# Altium footprint library IC_SMD_QUAD.PCBLIB: 101 footprints (part 7 of 7)
Each footprint in its own frame and in the unit in brackets; x right, y up, seen from the top. Pads: shape width x height; smd on the part's side, far side on the other; paste and mask are expansions set on the pad; w line width, h text height; cw(c..) or ccw(c..) is an arc to the next point about the centre after c.
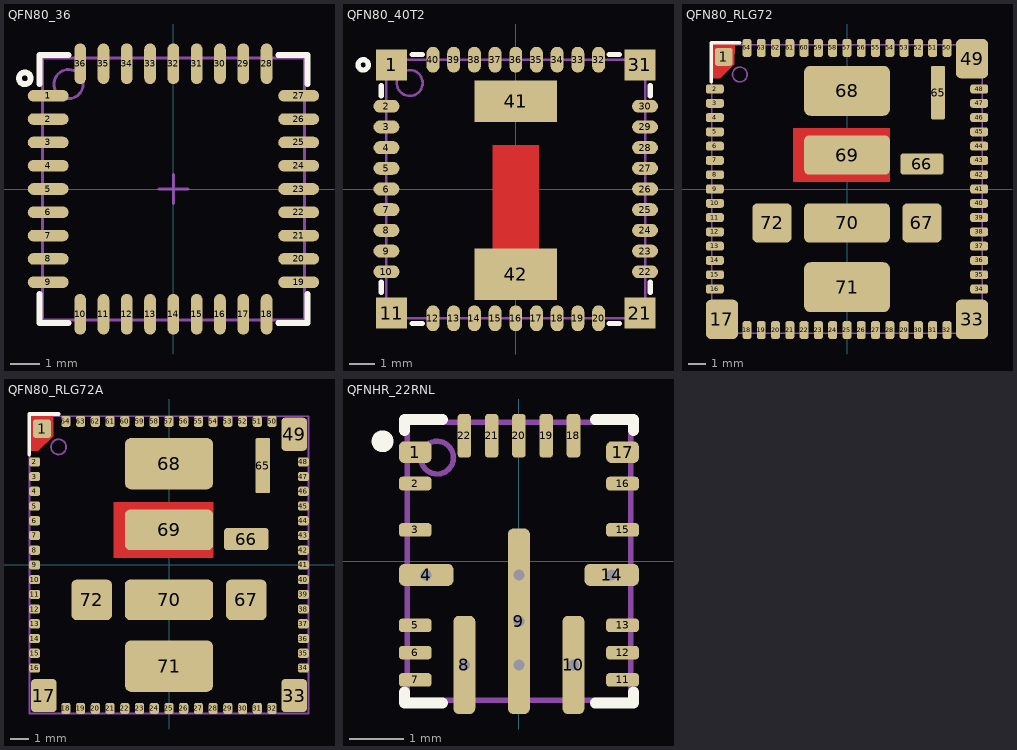
[diagram p6: the footprints below, top view; thin cyan lines are the x and y axes]

## QFN80_36 [mm] "LPCC (HMC6343)IDT72255, 9X9mm, 0.8mm"
height 2
pads (36):
  oval 1.4x0.4 smd mask+0.05: 1(-4.3,3.2) 2(-4.3,2.4) 3(-4.3,1.6) 4(-4.3,0.8) 5(-4.3,0) 6(-4.3,-0.8) 7(-4.3,-1.6) 8(-4.3,-2.4) 9(-4.3,-3.2) 19(4.3,-3.2) 20(4.3,-2.4) 21(4.3,-1.6) 22(4.3,-0.8) 23(4.3,0) 24(4.3,0.8) 25(4.3,1.6) 26(4.3,2.4) 27(4.3,3.2)
  oval 0.4x1.4 smd mask+0.05: 10(-3.2,-4.3) 11(-2.4,-4.3) 12(-1.6,-4.3) 13(-0.8,-4.3) 14(0,-4.3) 15(0.8,-4.3) 16(1.6,-4.3) 17(2.4,-4.3) 18(3.2,-4.3) 28(3.2,4.3) 29(2.4,4.3) 30(1.6,4.3) 31(0.8,4.3) 32(0,4.3) 33(-0.8,4.3) 34(-1.6,4.3) 35(-2.4,4.3) 36(-3.2,4.3)
TopOverlay:
  circle w0.2: c-5.1,3.8 r0.2
  lines w0.2: -4.6,-3.6 -4.6,-4.6 -3.6,-4.6 ; -4.6,3.6 -4.6,4.6 -3.6,4.6 ; 3.6,-4.6 4.6,-4.6 4.6,-3.6 ; 3.6,4.6 4.6,4.6 4.6,3.6
Mechanical13:
  circle w0.1: c-3.6,3.6 r0.5
  lines w0.1: -4.5,-4.5 4.5,-4.5 4.5,4.5 -4.5,4.5 -4.5,-4.5
Mechanical15:
  lines w0.1: -0.5,0 0.5,0 ; 0,-0.5 0,0.5
3D body "QFN80_36--.step": height 2, standoff 0, extent -4.5,-4.5 4.5,4.5

## QFN80_40T2 [mm] "QFN, 40-Leads, Body 10x10mm, Pitch 0.80mm RVQ (TI)"
height 4.4
pads (42):
  rect 1.2x1.2 smd mask+0.1: 1(-4.8,4.8) 11(-4.8,-4.8) 21(4.8,-4.8) 31(4.8,4.8)
  oval 1x0.5 smd mask+0.1: 2(-5,3.2) 3(-5,2.4) 4(-5,1.6) 5(-5,0.8) 6(-5,0) 7(-5,-0.8) 8(-5,-1.6) 9(-5,-2.4) 10(-5,-3.2) 22(5,-3.2) 23(5,-2.4) 24(5,-1.6) 25(5,-0.8) 26(5,0) 27(5,0.8) 28(5,1.6) 29(5,2.4) 30(5,3.2)
  oval 0.5x1 smd mask+0.1: 12(-3.2,-5) 13(-2.4,-5) 14(-1.6,-5) 15(-0.8,-5) 16(0,-5) 17(0.8,-5) 18(1.6,-5) 19(2.4,-5) 20(3.2,-5) 32(3.2,5) 33(2.4,5) 34(1.6,5) 35(0.8,5) 36(0,5) 37(-0.8,5) 38(-1.6,5) 39(-2.4,5) 40(-3.2,5)
  rect 3.2x1.6 smd mask+0.1: 41(0,3.4)
  rect 3.2x2 smd mask+0.1: 42(0,-3.3)
TopLayer:
  rectangle: -0.9,-2.4 0.9,1.7
TopOverlay:
  circle w0.2: c-5.9,4.8 r0.2
  lines w0.2: -5.2,-4 -5.2,-3.6 ; -5.2,3.6 -5.2,4 ; -4,-5.2 -3.6,-5.2 ; -4,5.2 -3.6,5.2 ; 3.6,-5.2 4,-5.2 ; 3.6,5.2 4,5.2 ; 5.2,-4 5.2,-3.6 ; 5.2,3.6 5.2,4
TopPaste:
  rectangle: -0.7,-1.9 0.7,1.6
TopSolder:
  rectangle: -1.7,-4.3 1.7,-2.9
  rectangle: -0.9,-2.9 0.9,1.8
Mechanical13:
  circle w0.1: c-4.1,4.1 r0.5
  lines w0.1: -5,-5 -5,5 5,5 5,-5 -5,-5
3D body: height 4.4, standoff 0.08, extent -5,-5 5,5

## QFN80_RLG72 [mm] "RLG-72, 0.8mm pitch, 15X16mm"
pads (72):
  rrect30% 1x1 smd paste-0.5 mask+0.051: 1(-6.9,7.4)
  rrect50% 1x0.5 smd paste+0 mask+0.075: 2(-7.4,5.6) 3(-7.4,4.8) 4(-7.4,4) 5(-7.4,3.2) 6(-7.4,2.4) 7(-7.4,1.6) 8(-7.4,0.8) 9(-7.4,0) 10(-7.4,-0.8) 11(-7.4,-1.6) 12(-7.4,-2.4) 13(-7.4,-3.2) 14(-7.4,-4) 15(-7.4,-4.8) 16(-7.4,-5.6) 34(7.4,-5.6) 35(7.4,-4.8) 36(7.4,-4) 37(7.4,-3.2) 38(7.4,-2.4) 39(7.4,-1.6) 40(7.4,-0.8) 41(7.4,0) 42(7.4,0.8) 43(7.4,1.6) 44(7.4,2.4) 45(7.4,3.2) 46(7.4,4) 47(7.4,4.8) 48(7.4,5.6)
  rrect30% 1.8x2.2 smd paste-0.2 mask+0.075: 17(-7,-7.3) 33(7,-7.3) 49(7,7.3)
  rrect50% 0.5x1 smd paste+0 mask+0.075: 18(-5.602,-7.9) 19(-4.802,-7.9) 20(-4.002,-7.9) 21(-3.202,-7.9) 22(-2.402,-7.9) 23(-1.602,-7.9) 24(-0.802,-7.9) 25(-0.002,-7.9) 26(0.798,-7.9) 27(1.598,-7.9) 28(2.398,-7.9) 29(3.198,-7.9) 30(3.998,-7.9) 31(4.798,-7.9) 32(5.598,-7.9) 50(5.598,7.9) 51(4.798,7.9) 52(3.998,7.9) 53(3.198,7.9) 54(2.398,7.9) 55(1.598,7.9) 56(0.798,7.9) 57(-0.002,7.9) 58(-0.802,7.9) 59(-1.602,7.9) 60(-2.402,7.9) 61(-3.202,7.9) 62(-4.002,7.9) 63(-4.802,7.9) 64(-5.602,7.9)
  rrect25% 0.8x3 smd paste-1 mask+0.075: 65(5.1,5.4)
  rrect25% 2.4x1.2 smd paste-2 mask+0.075: 66(4.2,1.4)
  rrect25% 2.2x2.2 smd paste-2 mask+0.075: 67(4.2,-1.9) 72(-4.2,-1.9)
  rrect25% 4.8x2.8 smd paste-3 mask+0.075: 68(0,5.5) 71(0,-5.5)
  rrect25% 4.8x2.2 smd paste-1.2 mask+0: 69(0,1.9)
  rrect25% 4.8x2.2 smd paste-2 mask+0.051: 70(0,-1.9)
TopLayer:
  region: -6.3,8.1 -7.5,8.1 -7.5,6.2 -7.1,6.2 -6.3,7
  region: -3,3.4 -3,0.4 2.398,0.4 2.398,3.4
TopOverlay:
  lines w0.2: -7.6,6 -7.6,8.2 -6,8.2
TopPaste:
  region: -7.5,6.6 -6.7,6.6 -7.08,6.22 -7.5,6.22
  region: -4.3,-2 -5.3,-2 -5.3,-3 -4.3,-3
  region: -4.1,-2 -3.1,-2 -3.1,-3 -4.1,-3
  region: -4.1,-1.8 -3.1,-1.8 -3.1,-0.8 -4.1,-0.8
  region: -4.3,-1.8 -5.3,-1.8 -5.3,-0.8 -4.3,-0.8
  region: -0.1,-5.6 -2.3,-5.6 -2.3,-6.8 -0.1,-6.8
  region: 0.1,-5.6 2.3,-5.6 2.3,-6.8 0.1,-6.8
  region: 0.1,-5.4 2.3,-5.4 2.3,-4.2 0.1,-4.2
  region: -0.1,-5.4 -2.3,-5.4 -2.3,-4.2 -0.1,-4.2
  region: -0.1,-2 -2.3,-2 -2.3,-3 -0.1,-3
  region: 0.1,-2 2.3,-2 2.3,-3 0.1,-3
  region: 0.1,-1.8 2.3,-1.8 2.3,-0.8 0.1,-0.8
  region: -0.1,-1.8 -2.3,-1.8 -2.3,-0.8 -0.1,-0.8
  region: -0.1,5.4 -2.3,5.4 -2.3,4.2 -0.1,4.2
  region: 0.1,5.4 2.3,5.4 2.3,4.2 0.1,4.2
  region: 0.1,5.6 2.3,5.6 2.3,6.8 0.1,6.8
  region: -7.4,7.3 -6.4,7.3 -6.4,6.9 -6.5,6.8 -7.4,6.8
  region: -7.4,8.1 -6.4,8.1 -6.4,7.5 -7.4,7.5
  region: -0.1,5.6 -2.3,5.6 -2.3,6.8 -0.1,6.8
  region: -0.1,2 -2.3,2 -2.3,3.2 -0.1,3.2
  region: 0.1,2 2.3,2 2.3,3.2 0.1,3.2
  region: 0.1,1.8 2.3,1.8 2.3,0.6 0.1,0.6
  region: -0.1,1.8 -2.3,1.8 -2.3,0.6 -0.1,0.6
  region: 4.1,-1.8 3.1,-1.8 3.1,-0.8 4.1,-0.8
  region: 4.3,-1.8 5.3,-1.8 5.3,-0.8 4.3,-0.8
  region: 4.3,-2 5.3,-2 5.3,-3 4.3,-3
  region: 4.1,-2 3.1,-2 3.1,-3 4.1,-3
  region: 4.1,0.8 3,0.8 3,1.3 4.1,1.3
  region: 4.3,0.8 5.4,0.8 5.4,1.3 4.3,1.3
  region: 4.3,2 5.4,2 5.4,1.5 4.3,1.5
  region: 4.1,2 3,2 3,1.5 4.1,1.5
  region: 4.7,5.3 4.7,3.9 5.5,3.9 5.5,5.3
  region: 4.7,5.5 4.7,6.9 5.5,6.9 5.5,5.5
Mechanical13:
  circle w0.1: c-6,6.412 r0.412
  lines w0.1: -7.575,-8.075 7.575,-8.075 7.575,8.075 -7.575,8.075 -7.575,-8.075
3D body: height 0.25, standoff 0, extent 0,0 0.254,0.254
3D body "LMZ31530_RLG0072A.stp": height 5.9, standoff 0, extent -7.5,-8 7.5,8

## QFN80_RLG72A [mm] "RLG-72, 0.8mm pitch, 15X16mm"
pads (72):
  rrect30% 1x1 smd paste-0.5 mask+0.051: 1(-6.9,7.4)
  rrect50% 0.6x0.5 smd paste+0 mask+0.075: 2(-7.3,5.6) 3(-7.3,4.8) 4(-7.3,4) 5(-7.3,3.2) 6(-7.3,2.4) 7(-7.3,1.6) 8(-7.3,0.8) 9(-7.3,0) 10(-7.3,-0.8) 11(-7.3,-1.6) 12(-7.3,-2.4) 13(-7.3,-3.2) 14(-7.3,-4) 15(-7.3,-4.8) 16(-7.3,-5.6) 34(7.3,-5.6) 35(7.3,-4.8) 36(7.3,-4) 37(7.3,-3.2) 38(7.3,-2.4) 39(7.3,-1.6) 40(7.3,-0.8) 41(7.3,0) 42(7.3,0.8) 43(7.3,1.6) 44(7.3,2.4) 45(7.3,3.2) 46(7.3,4) 47(7.3,4.8) 48(7.3,5.6)
  rrect30% 1.4x1.8 smd paste-0.2 mask+0.075: 17(-6.8,-7.1) 33(6.8,-7.1) 49(6.8,7.1)
  rrect50% 0.5x0.6 smd paste+0 mask+0.075: 18(-5.602,-7.8) 19(-4.802,-7.8) 20(-4.002,-7.8) 21(-3.202,-7.8) 22(-2.402,-7.8) 23(-1.602,-7.8) 24(-0.802,-7.8) 25(-0.002,-7.8) 26(0.798,-7.8) 27(1.598,-7.8) 28(2.398,-7.8) 29(3.198,-7.8) 30(3.998,-7.8) 31(4.798,-7.8) 32(5.598,-7.8) 50(5.598,7.8) 51(4.798,7.8) 52(3.998,7.8) 53(3.198,7.8) 54(2.398,7.8) 55(1.598,7.8) 56(0.798,7.8) 57(-0.002,7.8) 58(-0.802,7.8) 59(-1.602,7.8) 60(-2.402,7.8) 61(-3.202,7.8) 62(-4.002,7.8) 63(-4.802,7.8) 64(-5.602,7.8)
  rrect25% 0.8x3 smd paste-1 mask+0.075: 65(5.1,5.4)
  rrect25% 2.4x1.2 smd paste-2 mask+0.075: 66(4.2,1.4)
  rrect25% 2.2x2.2 smd paste-2 mask+0.075: 67(4.2,-1.9) 72(-4.2,-1.9)
  rrect25% 4.8x2.8 smd paste-3 mask+0.075: 68(0,5.5) 71(0,-5.5)
  rrect25% 4.8x2.2 smd paste-1.2 mask+0: 69(0,1.9)
  rrect25% 4.8x2.2 smd paste-2 mask+0.051: 70(0,-1.9)
TopLayer:
  region: -3,3.4 -3,0.4 2.398,0.4 2.398,3.4
  region: -6.3,8.1 -7.5,8.1 -7.5,6.2 -7.1,6.2 -6.3,7
TopOverlay:
  lines w0.2: -7.6,6 -7.6,8.2 -6,8.2
TopPaste:
  region: 4.7,5.5 4.7,6.9 5.5,6.9 5.5,5.5
  region: 4.7,5.3 4.7,3.9 5.5,3.9 5.5,5.3
  region: 4.1,2 3,2 3,1.5 4.1,1.5
  region: 4.3,2 5.4,2 5.4,1.5 4.3,1.5
  region: 4.3,0.8 5.4,0.8 5.4,1.3 4.3,1.3
  region: 4.1,0.8 3,0.8 3,1.3 4.1,1.3
  region: 4.1,-2 3.1,-2 3.1,-3 4.1,-3
  region: 4.3,-2 5.3,-2 5.3,-3 4.3,-3
  region: 4.3,-1.8 5.3,-1.8 5.3,-0.8 4.3,-0.8
  region: 4.1,-1.8 3.1,-1.8 3.1,-0.8 4.1,-0.8
  region: -0.1,1.8 -2.3,1.8 -2.3,0.6 -0.1,0.6
  region: 0.1,1.8 2.3,1.8 2.3,0.6 0.1,0.6
  region: 0.1,2 2.3,2 2.3,3.2 0.1,3.2
  region: -0.1,2 -2.3,2 -2.3,3.2 -0.1,3.2
  region: -0.1,5.6 -2.3,5.6 -2.3,6.8 -0.1,6.8
  region: -7.4,8.1 -6.4,8.1 -6.4,7.5 -7.4,7.5
  region: -7.4,7.3 -6.4,7.3 -6.4,6.9 -6.5,6.8 -7.4,6.8
  region: 0.1,5.6 2.3,5.6 2.3,6.8 0.1,6.8
  region: 0.1,5.4 2.3,5.4 2.3,4.2 0.1,4.2
  region: -0.1,5.4 -2.3,5.4 -2.3,4.2 -0.1,4.2
  region: -0.1,-1.8 -2.3,-1.8 -2.3,-0.8 -0.1,-0.8
  region: 0.1,-1.8 2.3,-1.8 2.3,-0.8 0.1,-0.8
  region: 0.1,-2 2.3,-2 2.3,-3 0.1,-3
  region: -0.1,-2 -2.3,-2 -2.3,-3 -0.1,-3
  region: -0.1,-5.4 -2.3,-5.4 -2.3,-4.2 -0.1,-4.2
  region: 0.1,-5.4 2.3,-5.4 2.3,-4.2 0.1,-4.2
  region: 0.1,-5.6 2.3,-5.6 2.3,-6.8 0.1,-6.8
  region: -0.1,-5.6 -2.3,-5.6 -2.3,-6.8 -0.1,-6.8
  region: -4.3,-1.8 -5.3,-1.8 -5.3,-0.8 -4.3,-0.8
  region: -4.1,-1.8 -3.1,-1.8 -3.1,-0.8 -4.1,-0.8
  region: -4.1,-2 -3.1,-2 -3.1,-3 -4.1,-3
  region: -4.3,-2 -5.3,-2 -5.3,-3 -4.3,-3
  region: -7.5,6.6 -6.7,6.6 -7.08,6.22 -7.5,6.22
Mechanical13:
  circle w0.1: c-6,6.412 r0.412
  lines w0.1: -7.575,-8.075 -7.575,8.075 7.575,8.075 7.575,-8.075 -7.575,-8.075
3D body: height 0.25, standoff 0, extent 0,0 0.254,0.254
3D body "LMZ31530_RLG0072A.stp": height 5.9, standoff 0, extent -7.5,-8 7.5,8

## QFNHR_22RNL [mm] "VQFN-HR22, RNL, 5X4X0.9mm"
height 0.9
pads (22):
  rrect50% 0.6x0.4 smd paste+0 mask+0.075: 1(-1.9,2) 17(1.9,2)
  rrect50% 0.6x0.25 smd paste+0 mask+0.075: 2(-1.9,1.425) 3(-1.9,0.575) 5(-1.9,-1.175) 6(-1.9,-1.675) 7(-1.9,-2.175) 11(1.9,-2.175) 12(1.9,-1.675) 13(1.9,-1.175) 15(1.9,0.575) 16(1.9,1.425)
  rrect50% 1x0.4 smd paste-0.5 mask+0.075: 4(-1.7,-0.25) 14(1.7,-0.25)
  rrect50% 0.4x1.8 smd paste-0.812 mask+0.075: 8(-1,-1.9) 10(1,-1.9)
  rrect50% 0.4x3.4 smd paste-1.562 mask+0.075: 9(0,-1.1)
  rrect50% 0.25x0.8 smd paste+0 mask+0.075: 18(1,2.3) 19(0.5,2.3) 20(0,2.3) 21(-0.5,2.3) 22(-1,2.3)
via 1.7,-0.25 diameter 0.4 hole 0.2
via -1.7,-0.25 diameter 0.4 hole 0.2
via -1,-1.9 diameter 0.4 hole 0.2
via 1,-1.9 diameter 0.4 hole 0.2
via 0,-1.9 diameter 0.4 hole 0.2
via 0,-0.25 diameter 0.4 hole 0.2
via 0,-1.1 diameter 0.4 hole 0.2
TopOverlay:
  circle w0.2: c-2.5,2.2 r0.1
  lines w0.2: -2.1,-2.4 -2.1,-2.6 -1.4,-2.6 ; -2.1,2.4 -2.1,2.6 -1.4,2.6 ; 1.4,-2.6 2.1,-2.6 2.1,-2.4 ; 1.4,2.6 2.1,2.6 2.1,2.4
TopPaste:
  drawing of 12 lines, arcs and shapes, not listed
Mechanical13:
  circle w0.1: c-1.5,1.9 r0.3
  lines w0.1: -2.05,-2.55 -2.05,2.55 2.05,2.55 2.05,-2.55 -2.05,-2.55
3D body: height 0.25, standoff 0, extent 0,0 0.254,0.254
3D body "RNL0022A.stp": height 0.9, standoff 0, extent -2,-2.5 2,2.5